# Altium footprint library SCT8-Board.PcbLib: 132 footprints (part 8 of 9)
Each footprint in its own frame and in the unit in brackets; x right, y up, seen from the top. Pads: shape width x height; smd on the part's side, far side on the other; paste and mask are expansions set on the pad; w line width, h text height; cw(c..) or ccw(c..) is an arc to the next point about the centre after c.
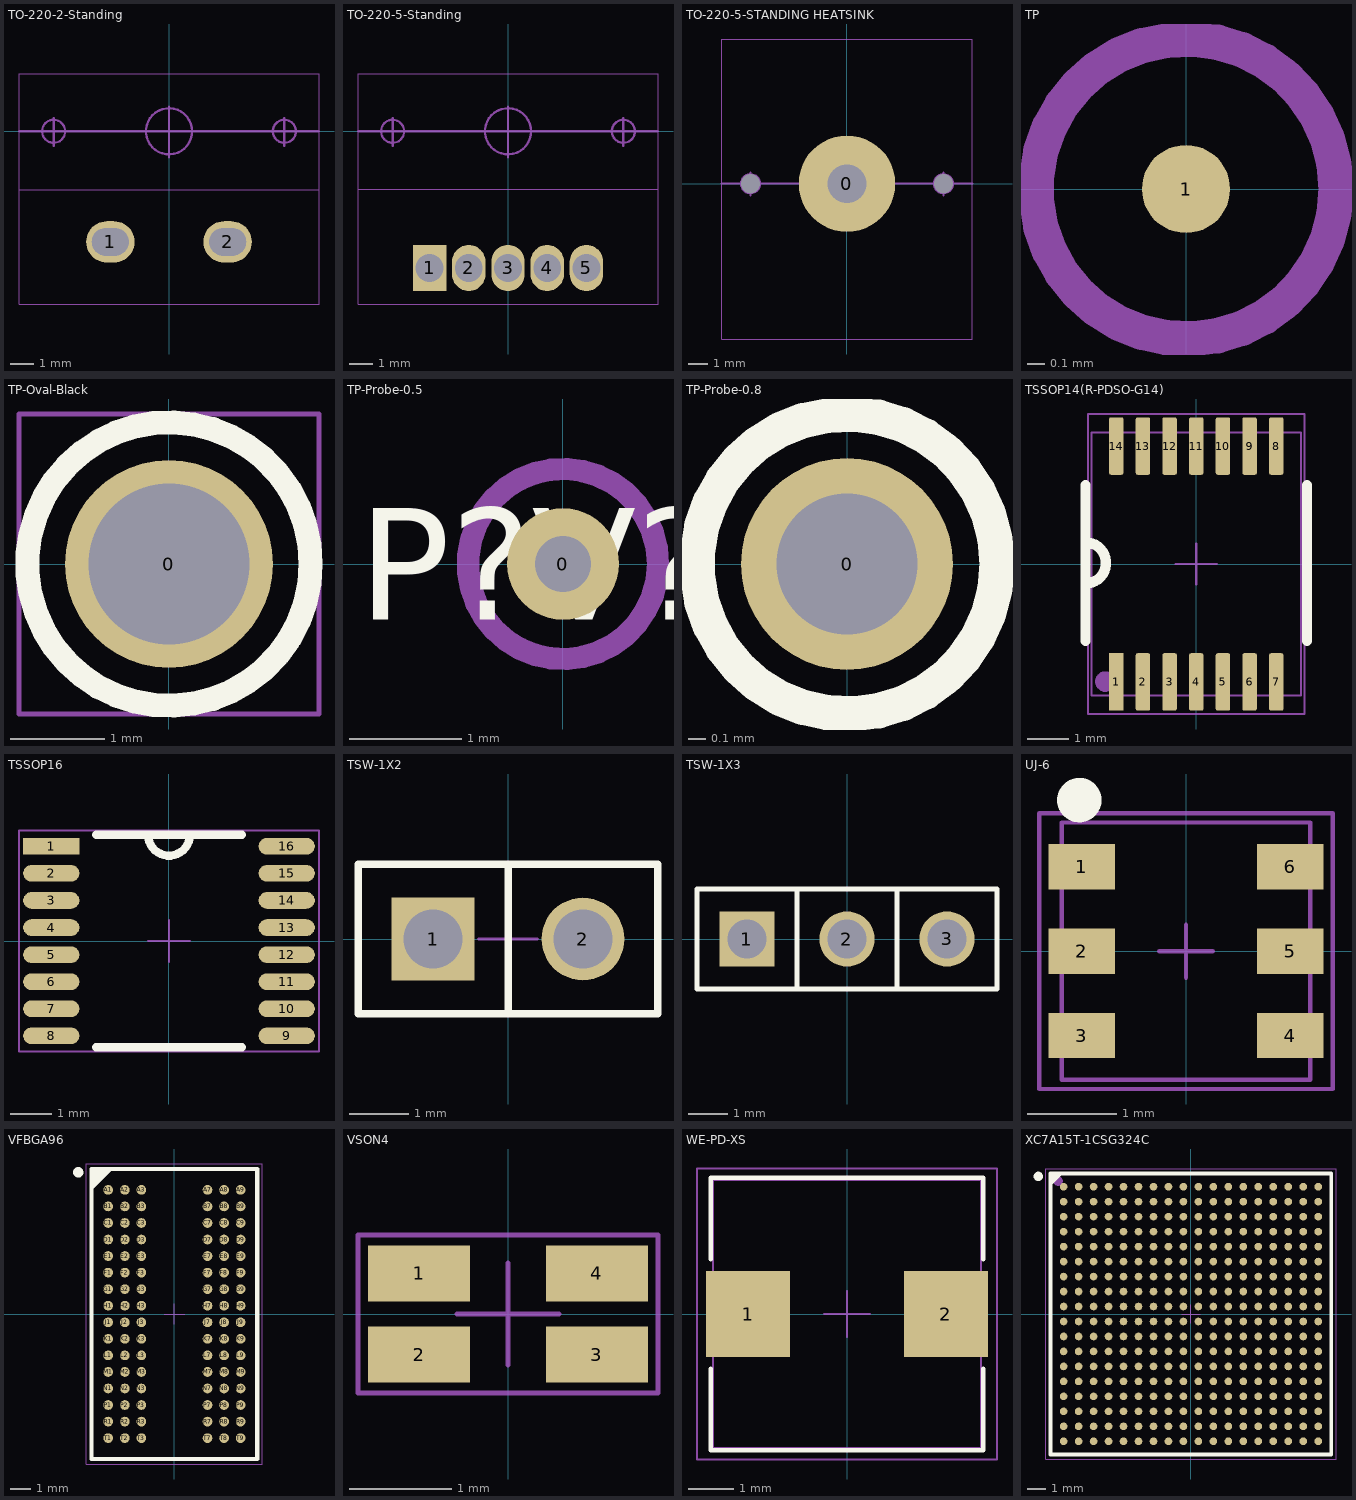
[diagram p7: the footprints below, top view; thin cyan lines are the x and y axes]

## TO-220-2-Standing [mm]
pads (2):
  oval 2.1x1.8 hole 1.2 slot 1.6 at 0 deg: 1(-2.54,-4.792) 2(2.54,-4.792)
Top Courtyard:
  lines w0.05: -6.5,-2.542 6.5,-2.542 ; -6.5,-7.5 -6.5,2.5 6.5,2.5 6.5,-7.5 -6.5,-7.5
Top Component Center:
  circle w0.1: c0,0 r1
  circle w0.1: c-5,0 r0.5
  circle w0.1: c5,0 r0.5
  lines w0.1: -6.5,0 6.5,0 ; -5,-0.621 -5,0.579 ; 0,-1.121 0,1.079 ; 5,-0.621 5,0.579
3D body "TO220-2-Standing.STEP": height 17.95, standoff -2.47, extent -4.826,-7.042 4.826,-2.542

## TO-220-5-Standing [mm]
pads (5):
  rect 1.45x2 hole 1.2: 1(-3.4,-5.921)
  oval 1.45x2 hole 1.2: 2(-1.7,-5.921) 3(0,-5.921) 4(1.7,-5.921) 5(3.4,-5.921)
Top Courtyard:
  lines w0.05: -6.5,-2.5 6.5,-2.5 ; -6.5,-7.5 -6.5,2.5 6.5,2.5 6.5,-7.5 -6.5,-7.5
Top Component Center:
  circle w0.1: c5,0 r0.5
  circle w0.1: c-5,0 r0.5
  circle w0.1: c0,0 r1
  lines w0.1: -6.5,0 6.5,0 ; -5,-0.621 -5,0.579 ; 0,-1.121 0,1.079 ; 5,-0.621 5,0.579
3D body "TO220-5-Standing.STEP": height 18.05, standoff -2.47, extent -5.335,-7.391 5.335,-2.551

## TO-220-5-STANDING HEATSINK [mm]
pads (3):
  round 0 hole 1 unplated paste+0: 0(-5,0) 0(5,0)
  round 5 / inner round 2.5 / far side round 6 hole 2 paste+0: 0(0,0)
Top Courtyard:
  lines w0.05: -6.5,-8.049 -6.5,7.5 6.5,7.5 6.5,-8.049 -6.5,-8.049
Top Component Center:
  circle w0.1: c0,0 r1
  circle w0.1: c-5,0 r0.5
  circle w0.1: c5,0 r0.5
  lines w0.1: -6.5,0 6.5,0 ; -5,-0.621 -5,0.579 ; 0,-1.121 0,1.079 ; 5,-0.621 5,0.579
3D body "TO220-5-HeatSinkAssembly.STEP": height 22, standoff -3.4, extent -6.5,-8.049 6.5,7.5

## TP [mm]
height 2.65
pads (1):
  round 0.5 smd: 1(0,0)
Test Points:
  circle w0.2: c0,0 r0.85
  text ".Designator" at -1.912,-0.192 h0.85

## TP-Oval-Black [mm]
pads (1):
  round 2.2 hole 1.7 paste+0 mask+0: 0(0,0)
Top Overlay:
  circle w0.254: c0,0 r1.5
Top Courtyard:
  lines w0.05: -1.587,-1.587 1.588,-1.587 1.588,1.588 -1.587,1.588 -1.587,-1.587
Top Designator:
  text ".Designator" at -1.46,-0.147 h0.65
Top Component Outline:
  lines w0.05: -1.587,-1.587 1.588,-1.587 1.588,1.588 -1.587,1.588 -1.587,-1.587
3D body "TP-Oval-Black.step": height 8.13, standoff -3.1, extent -1.587,-1.587 1.588,1.588

## TP-Probe-0.5 [mm] "Test Point 0.8 mm hole for Probe"
pads (1):
  round 1 hole 0.5 paste+0 mask+0: 0(0,0)
Top Overlay:
  text "P?V?" at -1.833,-0.5 h1
Test Points:
  circle w0.2: c0,0 r0.85
  text ".Designator" at -1.912,-0.192 h0.85

## TP-Probe-0.8 [mm] "Test Point 0.8 mm hole for Probe"
pads (1):
  round 1.2 hole 0.8 paste+0 mask+0: 0(0,0)
Top Overlay:
  circle w0.2: c0,0 r0.85
Top Designator:
  text ".Designator" at -1.912,-0.192 h0.85

## TSSOP14(R-PDSO-G14) [mm]
pads (14):
  rect 0.35x1.4 smd: 1(-1.95,-2.875)
  rrect25% 0.35x1.4 smd: 2(-1.3,-2.875) 3(-0.65,-2.875) 4(0,-2.875) 5(0.65,-2.875) 6(1.3,-2.875) 7(1.95,-2.875) 8(1.95,2.875) 9(1.3,2.875) 10(0.65,2.875) 11(0,2.875) 12(-0.65,2.875) 13(-1.3,2.875) 14(-1.95,2.875)
Top Overlay:
  lines w0.254: -2.7,-1.875 -2.7,1.925 ; -2.7,-0.475 ccw(c-2.7,0.025) -2.7,0.525 ; 2.7,-1.875 2.7,1.925
Top Courtyard:
  lines w0.05: -2.64,-3.656 -2.64,3.656 2.64,3.656 2.64,-3.656 -2.64,-3.656
Top Designator:
  text ".Designator" at -1.912,-0.192 h0.85
Top Component Center:
  lines w0.06: -0.5,0 0.5,0 ; 0,-0.5 0,0.5
Top Component Outline:
  circle w0.3: c-2.215,-2.865 r0.1
  lines w0.05: -2.55,-3.2 -2.55,3.2 2.55,3.2 2.55,-3.2 -2.55,-3.2
3D body "R-PDSO-G14.STEP": height 1.2, standoff 0, extent -2.55,-3.2 2.55,3.2

## TSSOP16 [mm] "IPC High Density"
height 1.1
pads (16):
  rect 1.35x0.4 smd: 1(-2.825,2.275)
  oval 1.35x0.4 smd: 2(-2.825,1.625) 3(-2.825,0.975) 4(-2.825,0.325) 5(-2.825,-0.325) 6(-2.825,-0.975) 7(-2.825,-1.625) 8(-2.825,-2.275) 9(2.825,-2.275) 10(2.825,-1.625) 11(2.825,-0.975) 12(2.825,-0.325) 13(2.825,0.325) 14(2.825,0.975) 15(2.825,1.625) 16(2.825,2.275)
Top Overlay:
  lines w0.2: -1.75,-2.55 1.75,-2.55 ; -1.75,2.55 1.75,2.55 ; -0.5,2.55 ccw(c0,2.55) 0.5,2.55
Top Courtyard:
  lines w0.05: -3.6,-2.65 3.6,-2.65 3.6,2.65 -3.6,2.65 -3.6,-2.65
Top Designator:
  text ".Designator" at -1.912,-0.192 h0.85
Top Component Center:
  lines w0.05: -0.5,0 0.5,0 ; 0,-0.5 0,0.5
3D body: height 1.1, standoff 0.15, extent -2.25,-2.55 2.25,2.55

## TSW-1X2 [mm]
height 10
pads (2):
  rect 1.4x1.4 hole 1: 1(-1.27,0)
  round 1.4 hole 1: 2(1.27,0)
Top Overlay:
  lines w0.127: 0,-1.27 0,1.27 ; -2.54,-1.27 2.54,-1.27 2.54,1.27 -2.54,1.27 -2.54,-1.27
Top Courtyard:
  lines w0.05: -2.54,-1.27 2.54,-1.27 2.54,1.27 -2.54,1.27 -2.54,-1.27
Top Designator:
  text ".Designator" at -1.912,-0.192 h0.85
Top Component Center:
  lines w0.05: -0.5,0 0.5,0 ; 0,-0.5 0,0.5
Top Component Outline:
  lines w0.05: -2.54,-1.27 -2.54,1.27 2.54,1.27 2.54,-1.27 -2.54,-1.27
3D body "Samtec-TSW-102-14-G-S.step": height 10.67, standoff -2.79, extent -2.54,-1.27 2.54,1.27

## TSW-1X3 [mm]
height 10
pads (3):
  rect 1.4x1.4 hole 1: 1(-2.54,0)
  round 1.4 hole 1: 2(0,0) 3(2.54,0)
Top Overlay:
  lines w0.127: -1.27,-1.27 -1.27,1.27 ; 1.27,-1.27 1.27,1.27 ; -3.81,-1.27 -3.81,1.27 3.81,1.27 3.81,-1.27 -3.81,-1.27
Top Courtyard:
  lines w0.05: -3.81,-1.27 3.81,-1.27 3.81,1.27 -3.81,1.27 -3.81,-1.27
Top Designator:
  text ".Designator" at -1.912,-0.192 h0.85
Top Component Center:
  lines w0.05: -0.5,0 0.5,0 ; 0,-0.5 0,0.5
Top Component Outline:
  lines w0.05: -3.81,-1.27 -3.81,1.27 3.81,1.27 3.81,0.635 3.81,-0.635 3.81,-1.27 -3.81,-1.27
3D body "TSW-103-14-G-S.stp": height 10.67, standoff -2.79, extent -3.937,-1.27 3.81,1.27

## UJ-6 [mil] "6-Lead Thin Small Outline Transistor Package [TSOT]"
pads (6):
  rect 29.41x20 smd: 1(-46.2,37.4) 2(-46.2,0) 3(-46.2,-37.4) 4(46.2,-37.4) 5(46.2,0) 6(46.2,37.4)
Top Overlay:
  circle w9.84: c-47.24,66.93 r4.92
Top Courtyard:
  lines w1.97: -65,-61.02 65,-61.02 65,61.02 -65,61.02 -65,-61.02
Top Designator:
  text ".Designator" at 5.33,-53.1 h23.62
Top Component Center:
  lines w1.97: -11.81,0 11.81,0 ; 0,-11.81 0,11.81
Top Component Outline:
  lines w1.97: -55,-57 -55,57.01 55,57.01 55,-57 -55,-57
3D body "UJ_6_ADI.step": height 39.09, standoff 0, extent -55,-57 55,57.01

## VFBGA96 [mm] "BGA, 96-Leads, Body 8.00x14.00mmx1.20mm, Pitch 0.80mm"
height 1.2
pads (96):
  round 0.47 smd: A1(-3.2,6) A2(-2.4,6) A3(-1.6,6) A7(1.6,6) A8(2.4,6) A9(3.2,6) B1(-3.2,5.2) B2(-2.4,5.2) B3(-1.6,5.2) B7(1.6,5.2) B8(2.4,5.2) B9(3.2,5.2) C1(-3.2,4.4) C2(-2.4,4.4) C3(-1.6,4.4) C7(1.6,4.4) C8(2.4,4.4) C9(3.2,4.4) D1(-3.2,3.6) D2(-2.4,3.6) D3(-1.6,3.6) D7(1.6,3.6) D8(2.4,3.6) D9(3.2,3.6) E1(-3.2,2.8) E2(-2.4,2.8) E3(-1.6,2.8) E7(1.6,2.8) E8(2.4,2.8) E9(3.2,2.8) F1(-3.2,2) F2(-2.4,2) F3(-1.6,2) F7(1.6,2) F8(2.4,2) F9(3.2,2) G1(-3.2,1.2) G2(-2.4,1.2) G3(-1.6,1.2) G7(1.6,1.2) G8(2.4,1.2) G9(3.2,1.2) H1(-3.2,0.4) H2(-2.4,0.4) H3(-1.6,0.4) H7(1.6,0.4) H8(2.4,0.4) H9(3.2,0.4) J1(-3.2,-0.4) J2(-2.4,-0.4) J3(-1.6,-0.4) J7(1.6,-0.4) J8(2.4,-0.4) J9(3.2,-0.4) K1(-3.2,-1.2) K2(-2.4,-1.2) K3(-1.6,-1.2) K7(1.6,-1.2) K8(2.4,-1.2) K9(3.2,-1.2) L1(-3.2,-2) L2(-2.4,-2) L3(-1.6,-2) L7(1.6,-2) L8(2.4,-2) L9(3.2,-2) M1(-3.2,-2.8) M2(-2.4,-2.8) M3(-1.6,-2.8) M7(1.6,-2.8) M8(2.4,-2.8) M9(3.2,-2.8) N1(-3.2,-3.6) N2(-2.4,-3.6) N3(-1.6,-3.6) N7(1.6,-3.6) N8(2.4,-3.6) N9(3.2,-3.6) P1(-3.2,-4.4) P2(-2.4,-4.4) P3(-1.6,-4.4) P7(1.6,-4.4) P8(2.4,-4.4) P9(3.2,-4.4) R1(-3.2,-5.2) R2(-2.4,-5.2) R3(-1.6,-5.2) R7(1.6,-5.2) R8(2.4,-5.2) R9(3.2,-5.2) T1(-3.2,-6) T2(-2.4,-6) T3(-1.6,-6) T7(1.6,-6) T8(2.4,-6) T9(3.2,-6)
Top Overlay:
  circle w0.25: c-4.65,6.85 r0.125
  region: -3.098,7 -4,6.098 -4,7
  lines w0.2: -4,6.098 -3.098,7 ; -4,-7 4,-7 4,7 -4,7 -4,-7
Top Courtyard:
  lines w0.05: -4.25,-7.25 4.25,-7.25 4.25,7.25 -4.25,7.25 -4.25,-7.25
Top Designator:
  text ".Designator" at -1.912,-0.192 h0.85
Top Component Center:
  lines w0.05: -0.5,0 0.5,0 ; 0,-0.5 0,0.5
Top Component Outline:
  lines w0.05: -4,-7 4,-7 4,7 -4,7 -4,-7
3D body: height 1.2, standoff 0.33, extent -4,-7 4,7

## VSON4 [mm] "Very Small Outline Non-leaded 4 terminals"
pads (4):
  rect 1x0.55 smd: 1(-0.875,0.4) 2(-0.875,-0.4) 3(0.875,-0.4) 4(0.875,0.4)
Top Overlay:
  text "." at -1.8,0.9 h3
Top Courtyard:
  lines w0.05: -1.475,-0.775 1.475,-0.775 1.475,0.775 -1.475,0.775 -1.475,-0.775
Top Designator:
  text ".Designator" at -1.126,-0.113 h0.5
Top Component Center:
  lines w0.05: -0.5,0 0.5,0 ; 0,-0.5 0,0.5
3D body "VSON4.STEP": height 1.35, standoff 0, extent -1.275,-0.725 1.275,0.725

## WE-PD-XS [mm]
height 3.3
pads (2):
  rect 1.85x1.9 smd: 1(-2.175,0) 2(2.175,0)
Top Overlay:
  lines w0.1: -3,-1.2 -3,-3 3,-3 3,-1.2 ; -3,1.2 -3,3 3,3 3,1.2
Top Courtyard:
  lines w0.05: -3.3,-3.2 3.3,-3.2 3.3,3.2 -3.3,3.2 -3.3,-3.2
Top Designator:
  text ".Designator" at -1.912,-0.192 h0.85
Top Component Center:
  lines w0.05: -0.5,0 0.5,0 ; 0,-0.5 0,0.5
Top Component Outline:
  lines w0.05: -2.95,-2.95 -2.95,2.95 2.95,2.95 2.95,-2.95 -2.95,-2.95
3D body: height 3.3, standoff 0, extent -2.95,-2.95 2.95,2.95

## XC7A15T-1CSG324C [mm] "BGA, 324-Leads, Body 15.00x15.00mmx1.50mm, Pitch 0.80mm"
height 1.5
pads (324):
  round 0.41 smd: A1(-6.8,6.8) A2(-6,6.8) A3(-5.2,6.8) A4(-4.4,6.8) A5(-3.6,6.8) A6(-2.8,6.8) A7(-2,6.8) A8(-1.2,6.8) A9(-0.4,6.8) A10(0.4,6.8) A11(1.2,6.8) A12(2,6.8) A13(2.8,6.8) A14(3.6,6.8) A15(4.4,6.8) A16(5.2,6.8) A17(6,6.8) A18(6.8,6.8) B1(-6.8,6) B2(-6,6) B3(-5.2,6) B4(-4.4,6) B5(-3.6,6) B6(-2.8,6) B7(-2,6) B8(-1.2,6) B9(-0.4,6) B10(0.4,6) B11(1.2,6) B12(2,6) B13(2.8,6) B14(3.6,6) B15(4.4,6) B16(5.2,6) B17(6,6) B18(6.8,6) C1(-6.8,5.2) C2(-6,5.2) C3(-5.2,5.2) C4(-4.4,5.2) C5(-3.6,5.2) C6(-2.8,5.2) C7(-2,5.2) C8(-1.2,5.2) C9(-0.4,5.2) C10(0.4,5.2) C11(1.2,5.2) C12(2,5.2) C13(2.8,5.2) C14(3.6,5.2) C15(4.4,5.2) C16(5.2,5.2) C17(6,5.2) C18(6.8,5.2) D1(-6.8,4.4) D2(-6,4.4) D3(-5.2,4.4) D4(-4.4,4.4) D5(-3.6,4.4) D6(-2.8,4.4) D7(-2,4.4) D8(-1.2,4.4) D9(-0.4,4.4) D10(0.4,4.4) D11(1.2,4.4) D12(2,4.4) D13(2.8,4.4) D14(3.6,4.4) D15(4.4,4.4) D16(5.2,4.4) D17(6,4.4) D18(6.8,4.4) E1(-6.8,3.6) E2(-6,3.6) E3(-5.2,3.6) E4(-4.4,3.6) E5(-3.6,3.6) E6(-2.8,3.6) E7(-2,3.6) E8(-1.2,3.6) E9(-0.4,3.6) E10(0.4,3.6) E11(1.2,3.6) E12(2,3.6) E13(2.8,3.6) E14(3.6,3.6) E15(4.4,3.6) E16(5.2,3.6) E17(6,3.6) E18(6.8,3.6) F1(-6.8,2.8) F2(-6,2.8) F3(-5.2,2.8) F4(-4.4,2.8) F5(-3.6,2.8) F6(-2.8,2.8) F7(-2,2.8) F8(-1.2,2.8) F9(-0.4,2.8) F10(0.4,2.8) F11(1.2,2.8) F12(2,2.8) F13(2.8,2.8) F14(3.6,2.8) F15(4.4,2.8) F16(5.2,2.8) F17(6,2.8) F18(6.8,2.8) G1(-6.8,2) G2(-6,2) G3(-5.2,2) G4(-4.4,2) G5(-3.6,2) G6(-2.8,2) G7(-2,2) G8(-1.2,2) G9(-0.4,2) G10(0.4,2) G11(1.2,2) G12(2,2) G13(2.8,2) G14(3.6,2) G15(4.4,2) G16(5.2,2) G17(6,2) G18(6.8,2) H1(-6.8,1.2) H2(-6,1.2) H3(-5.2,1.2) H4(-4.4,1.2) H5(-3.6,1.2) H6(-2.8,1.2) H7(-2,1.2) H8(-1.2,1.2) H9(-0.4,1.2) H10(0.4,1.2) H11(1.2,1.2) H12(2,1.2) H13(2.8,1.2) H14(3.6,1.2) H15(4.4,1.2) H16(5.2,1.2) H17(6,1.2) H18(6.8,1.2) J1(-6.8,0.4) J2(-6,0.4) J3(-5.2,0.4) J4(-4.4,0.4) J5(-3.6,0.4) J6(-2.8,0.4) J7(-2,0.4) J8(-1.2,0.4) J9(-0.4,0.4) J10(0.4,0.4) J11(1.2,0.4) J12(2,0.4) J13(2.8,0.4) J14(3.6,0.4) J15(4.4,0.4) J16(5.2,0.4) J17(6,0.4) J18(6.8,0.4) K1(-6.8,-0.4) K2(-6,-0.4) K3(-5.2,-0.4) K4(-4.4,-0.4) K5(-3.6,-0.4) K6(-2.8,-0.4) K7(-2,-0.4) K8(-1.2,-0.4) K9(-0.4,-0.4) K10(0.4,-0.4) K11(1.2,-0.4) K12(2,-0.4) K13(2.8,-0.4) K14(3.6,-0.4) K15(4.4,-0.4) K16(5.2,-0.4) K17(6,-0.4) K18(6.8,-0.4) L1(-6.8,-1.2) L2(-6,-1.2) L3(-5.2,-1.2) L4(-4.4,-1.2) L5(-3.6,-1.2) L6(-2.8,-1.2) L7(-2,-1.2) L8(-1.2,-1.2) L9(-0.4,-1.2) L10(0.4,-1.2) L11(1.2,-1.2) L12(2,-1.2) L13(2.8,-1.2) L14(3.6,-1.2) L15(4.4,-1.2) L16(5.2,-1.2) L17(6,-1.2) L18(6.8,-1.2) M1(-6.8,-2) M2(-6,-2) M3(-5.2,-2) M4(-4.4,-2) M5(-3.6,-2) M6(-2.8,-2) M7(-2,-2) M8(-1.2,-2) M9(-0.4,-2) M10(0.4,-2) M11(1.2,-2) M12(2,-2) M13(2.8,-2) M14(3.6,-2) M15(4.4,-2) M16(5.2,-2) M17(6,-2) M18(6.8,-2) N1(-6.8,-2.8) N2(-6,-2.8) N3(-5.2,-2.8) N4(-4.4,-2.8) N5(-3.6,-2.8) N6(-2.8,-2.8) N7(-2,-2.8) N8(-1.2,-2.8) N9(-0.4,-2.8) N10(0.4,-2.8) N11(1.2,-2.8) N12(2,-2.8) N13(2.8,-2.8) N14(3.6,-2.8) N15(4.4,-2.8) N16(5.2,-2.8) N17(6,-2.8) N18(6.8,-2.8) P1(-6.8,-3.6) P2(-6,-3.6) P3(-5.2,-3.6) P4(-4.4,-3.6) P5(-3.6,-3.6) P6(-2.8,-3.6) P7(-2,-3.6) P8(-1.2,-3.6) P9(-0.4,-3.6) P10(0.4,-3.6) P11(1.2,-3.6) P12(2,-3.6) P13(2.8,-3.6) P14(3.6,-3.6) P15(4.4,-3.6) P16(5.2,-3.6) P17(6,-3.6) P18(6.8,-3.6) R1(-6.8,-4.4) R2(-6,-4.4) R3(-5.2,-4.4) R4(-4.4,-4.4) R5(-3.6,-4.4) R6(-2.8,-4.4) R7(-2,-4.4) R8(-1.2,-4.4) R9(-0.4,-4.4) R10(0.4,-4.4) R11(1.2,-4.4) R12(2,-4.4) R13(2.8,-4.4) R14(3.6,-4.4) R15(4.4,-4.4) R16(5.2,-4.4) R17(6,-4.4) R18(6.8,-4.4) T1(-6.8,-5.2) T2(-6,-5.2) T3(-5.2,-5.2) T4(-4.4,-5.2) T5(-3.6,-5.2) T6(-2.8,-5.2) T7(-2,-5.2) T8(-1.2,-5.2) T9(-0.4,-5.2) T10(0.4,-5.2) T11(1.2,-5.2) T12(2,-5.2) T13(2.8,-5.2) T14(3.6,-5.2) T15(4.4,-5.2) T16(5.2,-5.2) T17(6,-5.2) T18(6.8,-5.2) U1(-6.8,-6) U2(-6,-6) U3(-5.2,-6) U4(-4.4,-6) U5(-3.6,-6) U6(-2.8,-6) U7(-2,-6) U8(-1.2,-6) U9(-0.4,-6) U10(0.4,-6) U11(1.2,-6) U12(2,-6) U13(2.8,-6) U14(3.6,-6) U15(4.4,-6) U16(5.2,-6) U17(6,-6) U18(6.8,-6) V1(-6.8,-6.8) V2(-6,-6.8) V3(-5.2,-6.8) V4(-4.4,-6.8) V5(-3.6,-6.8) V6(-2.8,-6.8) V7(-2,-6.8) V8(-1.2,-6.8) V9(-0.4,-6.8) V10(0.4,-6.8) V11(1.2,-6.8) V12(2,-6.8) V13(2.8,-6.8) V14(3.6,-6.8) V15(4.4,-6.8) V16(5.2,-6.8) V17(6,-6.8) V18(6.8,-6.8)
Top Overlay:
  circle w0.25: c-8.15,7.35 r0.125
  region: -6.956,7.5 -7.5,6.956 -7.5,7.5
  lines w0.2: -7.5,6.956 -6.956,7.5 ; -7.5,-7.5 7.5,-7.5 7.5,7.5 -7.5,7.5 -7.5,-7.5
Top Courtyard:
  lines w0.05: -7.75,-7.75 -7.75,7.75 7.75,7.75 7.75,-7.75 -7.75,-7.75
Top Designator:
  text ".Designator" at -2.252,-0.226 h1
Top Component Center:
  lines w0.05: -0.5,0 0.5,0 ; 0,-0.5 0,0.5
Top Component Outline:
  circle w0.254: c-7.1,7.1 r0.127
  lines w0.05: -7.5,-7.5 -7.5,7.5 7.5,7.5 7.5,-7.5 -7.5,-7.5
3D body "XC7A15T-1CSG324C.STEP": height 1.5, standoff 0, extent -7.5,-7.5 7.5,7.5